# Altium footprint library SMT.PcbLib: 379 footprints (part 6 of 24)
Each footprint in its own frame and in the unit in brackets; x right, y up, seen from the top. Pads: shape width x height; smd on the part's side, far side on the other; paste and mask are expansions set on the pad; w line width, h text height; cw(c..) or ccw(c..) is an arc to the next point about the centre after c.
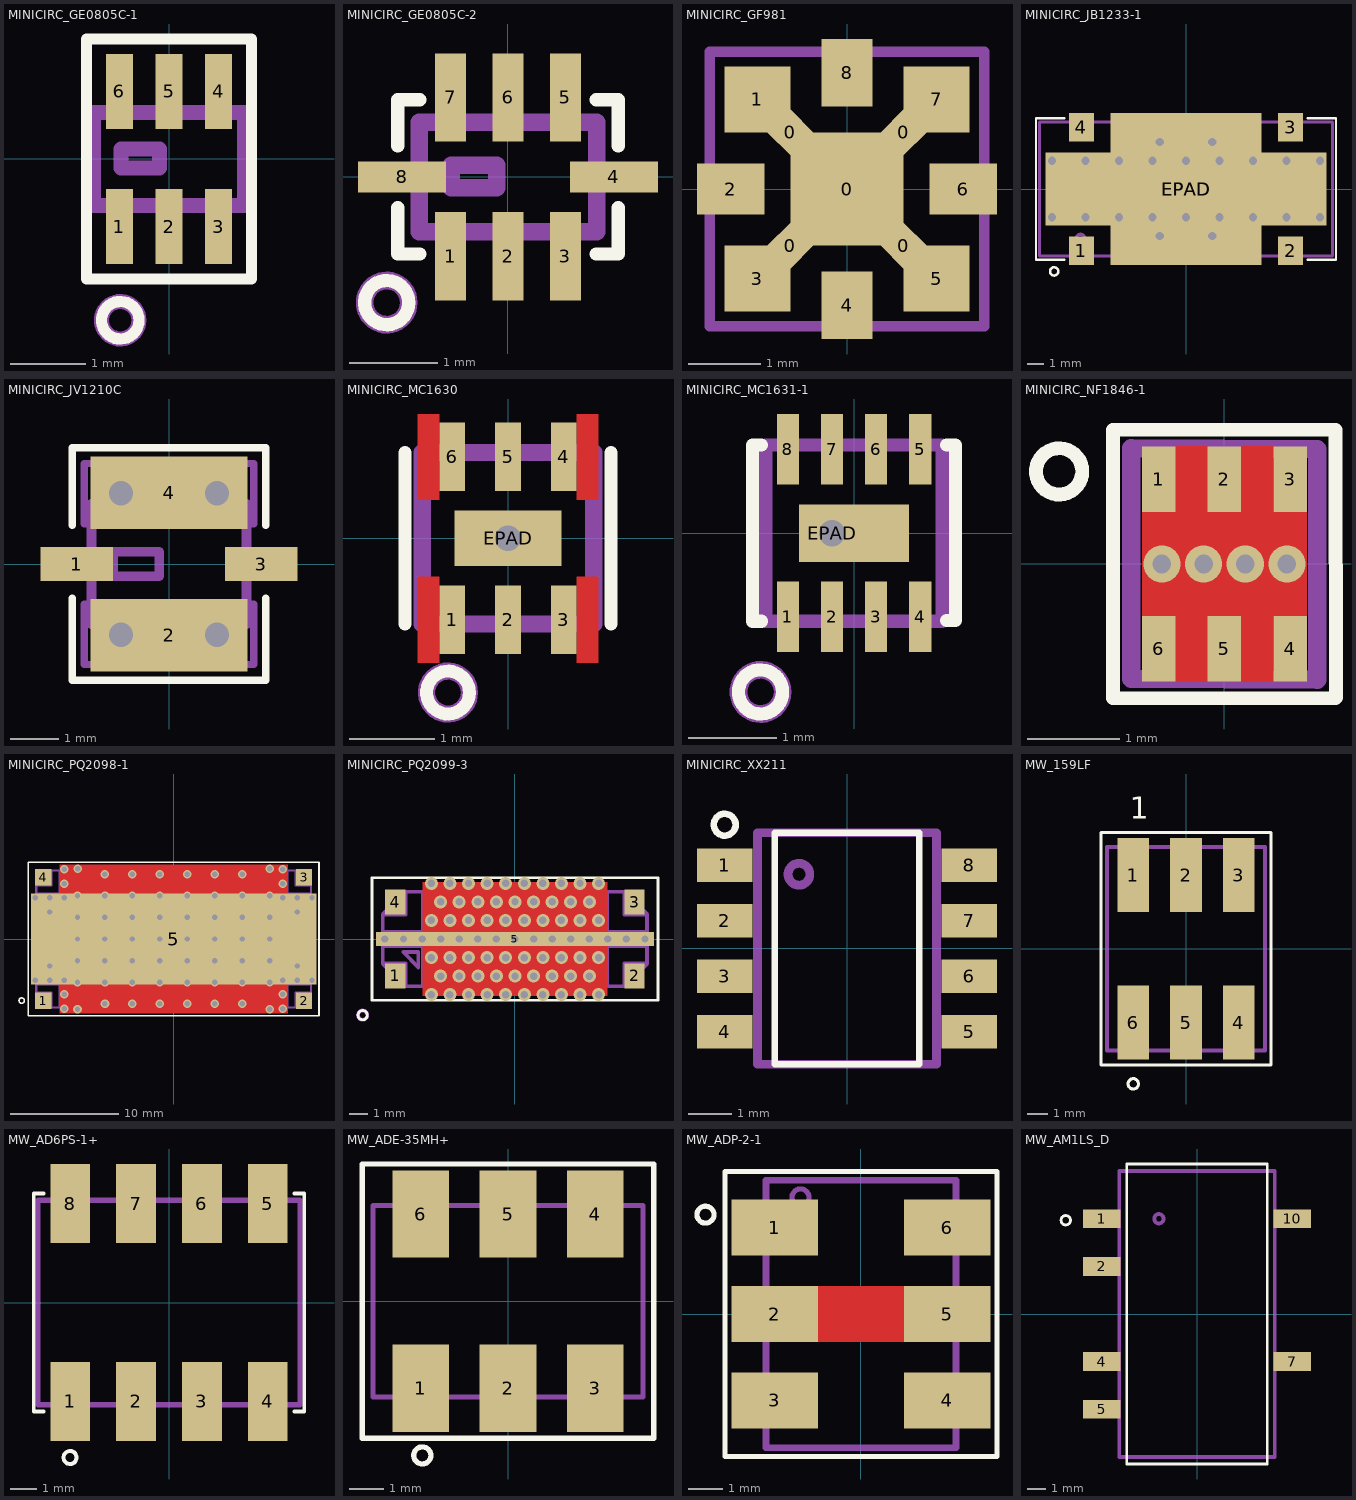
[diagram p5: the footprints below, top view; thin cyan lines are the x and y axes]

## MINICIRC_GE0805C-1 [mm] "6-Leads, Body 2.01x1.24mm, Pitch 0.65mm"
height 1.07
pads (6):
  rect 0.36x1 smd mask+0.05: 1(-0.66,-0.9) 2(0,-0.9) 3(0.66,-0.9) 4(0.66,0.9) 5(0,0.9) 6(-0.66,0.9)
Top Overlay:
  circle w0.15: c-0.65,-2.15 r0.25
  lines w0.15: -1.1,-1.6 1.1,-1.6 1.1,1.6 -1.1,1.6 -1.1,-1.6
Mechanical 1:
  circle w0.2: c-0.65,-2.15 r0.25
  lines w0.2: -1.005,-0.62 1.005,-0.62 1.005,0.62 -1.005,0.62 -1.005,-0.62 ; -0.643,-0.123 -0.643,0.131 -0.127,0.131 -0.127,-0.123 -0.643,-0.123
3D body "NCS2-392+.stp": height 0.87, standoff 0.03, extent -1.005,-0.62 1.005,0.62

## MINICIRC_GE0805C-2 [mm] "8-Leads, Body 2.0x1.25mm, Pitch 0.65mm"
height 0.95
pads (8):
  rect 0.35x1 smd mask+0.05: 1(-0.65,-0.9) 2(0,-0.9) 3(0.65,-0.9) 5(0.65,0.9) 6(0,0.9) 7(-0.65,0.9)
  rect 1x0.35 smd mask+0.05: 4(1.2,0) 8(-1.2,0)
Top Overlay:
  circle w0.15: c-1.375,-1.425 r0.25
  lines w0.15: -1.25,-0.35 -1.25,-0.875 -1,-0.875 ; -1.25,0.35 -1.25,0.875 -1,0.875 ; 1,-0.875 1.25,-0.875 1.25,-0.35 ; 1,0.875 1.25,0.875 1.25,0.35
Mechanical 1:
  circle w0.2: c-1.375,-1.425 r0.25
  lines w0.2: -1.005,-0.62 -1.005,0.62 1.005,0.62 1.005,-0.62 -1.005,-0.62 ; -0.643,-0.123 -0.127,-0.123 -0.127,0.131 -0.643,0.131 -0.643,-0.123
3D body "User Library-GE0805C-2.STEP": height 0.94, standoff -0.01, extent -1.015,-0.64 1.015,0.64

## MINICIRC_GF981 [mil]
height 31.89
pads (13):
  rect 18x30 smd rot 135: 0(-31,-31) 0(31,31)
  rect 18x30 smd rot 45: 0(-31,31) 0(31,-31)
  rect 62x62 smd: 0(0,0)
  rect 36x36 smd: 1(-49,49) 3(-49,-49) 5(49,-49) 7(49,49)
  rect 37x28 smd: 2(-63.5,0) 6(63.5,0)
  rect 28x37 smd: 4(0,-63.5) 8(0,63.5)
Mechanical 1:
  lines w5.91: -75,-75 -75,75 75,75 75,-75 -75,-75
Mechanical 20:
  text "Необходима прошивка, / см. PDF" at -285.05,-38.98 h70.87
3D body "GF981.stp": height 32.49, standoff 0.6, extent -75,-75 75,75

## MINICIRC_JB1233-1 [mil] "Bi-Directional Coupler"
height 200
pads (6):
  rect 60x67 smd: 1(-250,-147.5) 2(250,-147.5) 3(250,147.5) 4(-250,147.5)
  rect 670x175 smd paste-393.7 mask+4: EPAD(0,0)
  rect 360x362 smd paste-393.7: EPAD(0,0)
via 62.5,-112.5 diameter 31.5 hole 19.68
via -62.5,-112.5 diameter 31.5 hole 19.68
via -62.5,112.5 diameter 31.5 hole 19.68
via 62.5,112.5 diameter 31.5 hole 19.68
via 320,-67.5 diameter 31.5 hole 19.68
via 240,-67.5 diameter 31.5 hole 19.68
via 160,-67.5 diameter 31.5 hole 19.68
via 80,-67.5 diameter 31.5 hole 19.68
via 0,-67.5 diameter 31.5 hole 19.68
via 320,67.5 diameter 31.5 hole 19.68
via 240,67.5 diameter 31.5 hole 19.68
via 160,67.5 diameter 31.5 hole 19.68
via 80,67.5 diameter 31.5 hole 19.68
via 0,67.5 diameter 31.5 hole 19.68
via -80,-67.5 diameter 31.5 hole 19.68
via -160,-67.5 diameter 31.5 hole 19.68
via -240,-67.5 diameter 31.5 hole 19.68
via -320,-67.5 diameter 31.5 hole 19.68
via -80,67.5 diameter 31.5 hole 19.68
via -160,67.5 diameter 31.5 hole 19.68
via -240,67.5 diameter 31.5 hole 19.68
via -320,67.5 diameter 31.5 hole 19.68
Top Overlay:
  circle w5.91: c-314.96,-196.85 r9.84
  lines w5.91: -291.34,-169.29 -358.27,-169.29 -358.27,169.29 -291.34,169.29 ; 291.34,-169.29 358.27,-169.29 358.27,169.29 291.34,169.29
Top Paste:
  rectangle: -322.83,-31.5 322.83,31.5
  rectangle: -29.53,114.17 29.53,178.15
  rectangle: -154.72,114.17 -95.67,178.15
  region: 154.72,178.15 95.67,178.15 95.67,114.17 154.72,114.17
  region: 154.72,-114.17 95.67,-114.17 95.67,-178.15 154.72,-178.15
  rectangle: -154.72,-178.15 -95.67,-114.17
  rectangle: -29.53,-178.15 29.53,-114.17
Top Solder:
  rectangle: -335.63,-47.5 335.63,47.5
  rectangle: -180,87.5 180,181
  rectangle: -180,-181 180,-87.5
Mechanical 1:
  circle w7.87: c-251.97,-118.11 r9.84
  lines w7.87: -350,-160.04 -350,160.04 -261.42,160.04 ccw(c-250.39,160.04) -239.37,160.04 -136.22,160.04 ccw(c-125.2,160.04) -114.17,160.04 -11.02,160.04 ccw(c0,160.04) 11.02,160.04 114.17,160.04 ccw(c125.2,160.04) 136.22,160.04 239.37,160.04 ccw(c250.39,160.04) 261.42,160.04 350,160.04 350,-160.04 261.42,-160.04 ccw(c250.39,-160.04) 239.37,-160.04 136.22,-160.04 ccw(c125.2,-160.04) 114.17,-160.04 11.02,-160.04 ccw(c0,-160.04) -11.02,-160.04 -114.17,-160.04 ccw(c-125.2,-160.04) -136.22,-160.04 -239.37,-160.04 ccw(c-250.39,-160.04) -261.42,-160.04 -350,-160.04
Mechanical 20:
  text "Требуется прошивка, см. PDF" at -352.5,262 h60
3D body "JB1233-1.stp": height 140.16, standoff 0, extent -349.99,-160.03 350.01,160.04

## MINICIRC_JV1210C [mil] "Small size 3.2mm x 2.5 mm High Pass Filter"
height 62.99
pads (4):
  rect 59x28 smd mask+1.97: 1(-75,0) 3(75,0)
  rect 128x59 smd mask+1.97: 2(0,-58) 4(0,58)
via -39,57.5 diameter 39.37 hole 19.68
via 39,57.5 diameter 39.37 hole 19.68
via 39,-57.5 diameter 39.37 hole 19.68
via -39,-57.5 diameter 39.37 hole 19.68
Top Overlay:
  lines w5.91: -78.74,-27.56 -78.74,-94.49 78.74,-94.49 78.74,-27.56 ; -78.74,31.5 -78.74,94.49 78.74,94.49 78.74,31.5
Mechanical 1:
  lines w7.87: -62.99,-49.02 62.99,-49.02 62.99,49.02 -62.99,49.02 -62.99,-49.02 ; -45.57,-9.95 -45.57,9.95 -7.87,9.95 -7.87,-9.95 -45.57,-9.95
Mechanical 5:
  lines w5.91: -68.9,-81.76 -68.9,-32.55 68.9,-32.55 68.9,-81.76 -68.9,-81.76 ; -68.9,32.55 68.9,32.55 68.9,81.76 -68.9,81.76 -68.9,32.55
Mechanical 20:
  text "Отв.0,5  / must be plugged" at -187.01,-39.37 h39.37
3D body "JV1210C.stp": height 63.39, standoff 0, extent -62.99,-49.01 63,49.02

## MINICIRC_MC1630 [mm] "SMD, Body:2.00x2.00x0.85mm, Thermal Pad:1.25x0.65, 6-Leads, Pitch 0.65mm"
height 0.85
pads (7):
  rect 0.3x0.8 smd paste+0 mask+0.05: 1(-0.65,-0.95) 2(0,-0.95) 3(0.65,-0.95) 4(0.65,0.95) 5(0,0.95) 6(-0.65,0.95)
  rect 1.25x0.65 hole 0.3 mask+0.05: EPAD(0,0)
Top Layer:
  pour cut-out: 0.8,0.45 0.8,1.45 1.05,1.45 1.05,0.45
  pour cut-out: -0.8,-0.45 -0.8,-1.45 -1.05,-1.45 -1.05,-0.45
  pour cut-out: 0.8,-1.45 0.8,-0.45 1.05,-0.45 1.05,-1.45
  pour cut-out: -0.8,1.45 -0.8,0.45 -1.05,0.45 -1.05,1.45
Top Overlay:
  circle w0.15: c-0.7,-1.8 r0.25
  lines w0.15: -1.2,-1 -1.2,1 ; 1.2,-1 1.2,1
Top Paste:
  region: 0.6,-0.3 -0.6,-0.3 -0.6,0.3 0.6,0.3
Mechanical 1:
  circle w0.2: c-0.7,-1.8 r0.25
  lines w0.2: -1,-1 1,-1 1,1 -1,1 -1,-1
Mechanical 20:
  text "Есть рекомендации по" at -3.9,3.3 h1
  text "прошивке, зоны запрета, см. Pdf" at -5.5,2.4 h1
3D body "Микросхема YAT-2+ (MC1630) Mini-Circuits.stp": height 0.85, standoff 0, extent -1.001,-1.01 0.999,1.01

## MINICIRC_MC1631-1 [mm] "SMD, Body:2.00x2.00x1.05mm, Thermal Pad:1.25x0.65, 8-Leads, Pitch 0.5mm"
height 1.05
pads (9):
  rect 0.25x0.8 smd mask+0.05: 1(-0.75,-0.95) 2(-0.25,-0.95) 3(0.25,-0.95) 4(0.75,-0.95) 5(0.75,0.95) 6(0.25,0.95) 7(-0.25,0.95) 8(-0.75,0.95)
  rect 1.25x0.65 hole 0.3 copper offset 0.25,0 mask+0.05: EPAD(-0.25,0)
Top Overlay:
  circle w0.15: c-1.06,-1.8 r0.25
  lines w0.15: -1.05,-1 -1.15,-1 -1.15,1 -1.05,1 ; 1.05,-0.99 1.15,-0.99 1.15,1 1.05,1
Top Paste:
  region: -0.625,0.325 0.625,0.325 0.625,-0.325 -0.625,-0.325
Mechanical 1:
  circle w0.2: c-1.06,-1.8 r0.25
  lines w0.15: -1,-1 -1,1 1,1 1,-1 -1,-1
Mechanical 20:
  text "прошивке, см. Pdf" at -3.3,1.86 h1
  text "Есть рекомендации по" at -4.1,2.66 h1
3D body "Микросхема EQY-4-63+ (MC1631-1).stp": height 1.05, standoff 0, extent -1,-1.01 1,1.01

## MINICIRC_NF1846-1 [mm] "6-Leads, Body 2.01x2.49mm, Pitch 0.71mm"
height 0.89
pads (6):
  rect 0.36x0.71 smd mask+0.05: 1(-0.71,0.915) 2(0,0.915) 3(0.71,0.915) 4(0.71,-0.915) 5(0,-0.915) 6(-0.71,-0.915)
via 0.225,0 diameter 0.4 hole 0.2
via -0.225,0 diameter 0.4 hole 0.2
via 0.675,0 diameter 0.4 hole 0.2
via -0.675,0 diameter 0.4 hole 0.2
Top Layer:
  region: -0.18,-0.56 -0.18,-0.205 -0.89,-0.205 -0.89,0.56 -0.53,0.56 -0.53,0.205 0.53,0.205 0.53,0.56 0.89,0.56 0.89,-0.205 0.18,-0.205 0.18,-0.56
  pour cut-out: 0.18,-0.205 0.89,-0.205 0.89,-0.56 0.53,-0.56 0.53,-1.27 0.18,-1.27
  pour cut-out: -0.89,-0.205 -0.18,-0.205 -0.18,-1.27 -0.53,-1.27 -0.53,-0.56 -0.89,-0.56
  pour cut-out: -0.53,1.27 -0.53,0.205 0.53,0.205 0.53,1.27 0.18,1.27 0.18,0.56 -0.18,0.56 -0.18,1.27
Top Overlay:
  circle w0.15: c-1.785,1 r0.25
  lines w0.15: -1.205,-1.45 -1.205,1.45 1.2,1.45 ; -1.2,-1.45 1.2,-1.45 ; 1.2,1.44 1.205,-1.44
Top Solder:
  region: -0.23,-0.51 -0.23,-0.25 -0.94,-0.25 -0.94,0.52 -0.48,0.52 -0.48,0.25 0.48,0.25 0.48,0.52 0.94,0.52 0.94,-0.25 0.23,-0.25 0.23,-0.51
Mechanical 1:
  circle w0.2: c-0.495,0.72 r0.25
  lines w0.2: -1.005,-1.241 1.005,-1.249 1.005,1.241 -1.005,1.249 -1.005,-1.241
Mechanical 20:
  text "Прошивка  / по datasheet" at -2.37,-1.005 h1.2
3D body "NCR2-123+.stp": height 0.89, standoff -0.01, extent -1.005,-1.245 1.005,1.245

## MINICIRC_PQ2098-1 [mm] "Power Splitter/Combiner"
height 5.08
pads (5):
  rect 1.52x1.52 smd: 1(-12.065,-5.715) 2(12.065,-5.715) 3(12.065,5.715) 4(-12.065,5.715)
  rect 26.41x8.39 smd paste-10: 5(0,0)
via -11.45,2.5 diameter 0.8 hole 0.5
via -11.45,-2.5 diameter 0.8 hole 0.5
via 11.45,-2.5 diameter 0.8 hole 0.5
via 11.45,2.5 diameter 0.8 hole 0.5
via -8.89,0 diameter 0.8 hole 0.5
via -6.35,0 diameter 0.8 hole 0.5
via -3.81,0 diameter 0.8 hole 0.5
via -1.27,0 diameter 0.8 hole 0.5
via 8.89,0 diameter 0.8 hole 0.5
via 6.35,0 diameter 0.8 hole 0.5
via -10.1,6.45 diameter 0.8 hole 0.5
via -10.1,3.8 diameter 0.8 hole 0.5
via -12.8,3.8 diameter 0.8 hole 0.5
via -11.45,3.8 diameter 0.8 hole 0.5
via -10.1,5.1 diameter 0.8 hole 0.5
via -10.1,-5.1 diameter 0.8 hole 0.5
via -11.45,-3.8 diameter 0.8 hole 0.5
via -12.8,-3.8 diameter 0.8 hole 0.5
via -10.1,-3.8 diameter 0.8 hole 0.5
via -10.1,-6.45 diameter 0.8 hole 0.5
via 10.1,-5.1 diameter 0.8 hole 0.5
via 11.45,-3.8 diameter 0.8 hole 0.5
via 12.8,-3.8 diameter 0.8 hole 0.5
via 10.1,-3.8 diameter 0.8 hole 0.5
via 10.1,-6.45 diameter 0.8 hole 0.5
via 10.1,5.1 diameter 0.8 hole 0.5
via 11.45,3.8 diameter 0.8 hole 0.5
via 12.8,3.8 diameter 0.8 hole 0.5
via 10.1,3.8 diameter 0.8 hole 0.5
via 10.1,6.45 diameter 0.8 hole 0.5
via 1.27,0 diameter 0.8 hole 0.5
via 3.81,0 diameter 0.8 hole 0.5
via -8.89,2 diameter 0.8 hole 0.5
via -8.89,-2 diameter 0.8 hole 0.5
via -8.89,-4 diameter 0.8 hole 0.5
via -8.89,4 diameter 0.8 hole 0.5
via 3.81,2 diameter 0.8 hole 0.5
via 1.27,2 diameter 0.8 hole 0.5
via 6.35,2 diameter 0.8 hole 0.5
via 8.89,2 diameter 0.8 hole 0.5
via -1.27,2 diameter 0.8 hole 0.5
via -3.81,2 diameter 0.8 hole 0.5
via -6.35,2 diameter 0.8 hole 0.5
via 3.81,4 diameter 0.8 hole 0.5
via 1.27,4 diameter 0.8 hole 0.5
via 6.35,4 diameter 0.8 hole 0.5
via 8.89,4 diameter 0.8 hole 0.5
via -1.27,4 diameter 0.8 hole 0.5
via -3.81,4 diameter 0.8 hole 0.5
via -6.35,4 diameter 0.8 hole 0.5
via 3.81,-2 diameter 0.8 hole 0.5
via 1.27,-2 diameter 0.8 hole 0.5
via 6.35,-2 diameter 0.8 hole 0.5
via 8.89,-2 diameter 0.8 hole 0.5
via -1.27,-2 diameter 0.8 hole 0.5
via -3.81,-2 diameter 0.8 hole 0.5
via -6.35,-2 diameter 0.8 hole 0.5
via 3.81,-4 diameter 0.8 hole 0.5
via 1.27,-4 diameter 0.8 hole 0.5
via 6.35,-4 diameter 0.8 hole 0.5
via 8.89,-4 diameter 0.8 hole 0.5
via -1.27,-4 diameter 0.8 hole 0.5
via -3.81,-4 diameter 0.8 hole 0.5
via -6.35,-4 diameter 0.8 hole 0.5
via -8.88,6.5 diameter 0.8 hole 0.5
via -6.35,-6 diameter 0.8 hole 0.5
via -3.81,-6 diameter 0.8 hole 0.5
via -1.27,-6 diameter 0.8 hole 0.5
via 8.89,-6.5 diameter 0.8 hole 0.5
via 6.35,-6 diameter 0.8 hole 0.5
via 1.27,-6 diameter 0.8 hole 0.5
via 3.81,-6 diameter 0.8 hole 0.5
via -8.89,-6.5 diameter 0.8 hole 0.5
via -6.36,6 diameter 0.8 hole 0.5
via -3.82,6 diameter 0.8 hole 0.5
via -1.28,6 diameter 0.8 hole 0.5
via 8.9,6.5 diameter 0.8 hole 0.5
via 6.34,6 diameter 0.8 hole 0.5
via 1.26,6 diameter 0.8 hole 0.5
via 3.8,6 diameter 0.8 hole 0.5
Top Layer:
  region: -10.545,6.855 10.545,6.855 10.545,-6.855 -10.545,-6.855
Top Overlay:
  circle w0.15: c-14.05,-5.7 r0.25
  lines w0.15: -13.45,-7.1 -13.45,7.1 13.45,7.1 13.45,-7.1 -13.45,-7.1
Top Solder:
  region: -10.64,6.955 10.64,6.955 10.64,-6.955 -10.64,-6.955
Mechanical 1:
  circle w0.2: c-9.5,-5.4 r0.25
  lines w0.2: -12.7,-4.95 -11.3,-4.95 -11.3,-6.35 ; -12.7,-4.95 -12.7,-5.5 -11.85,-6.35 -11.3,-6.35 ; -12.7,-4.95 -12.7,-4.19 ; -12.7,-4.19 -10.54,-4.19 -10.54,-6.35 ; -12.7,-4.19 -12.7,-2.54 -12.37,-2.21 -12.37,2.21 -12.7,2.54 -12.7,4.19 ; -12.7,4.19 -10.54,4.19 -10.54,6.35 ; -12.7,4.19 -12.7,4.95 ; -12.7,4.95 -11.3,4.95 -11.3,6.35 ; -12.7,4.95 -12.7,5.5 -11.85,6.35 -11.3,6.35 ; -11.3,-6.35 -10.54,-6.35 ; -11.3,6.35 -10.54,6.35 ; -10.54,-6.35 -8.89,-6.35 -8.56,-6.02 8.56,-6.02 8.89,-6.35 10.54,-6.35 ; -10.54,6.35 -8.89,6.35 -8.56,6.02 8.56,6.02 8.89,6.35 10.54,6.35 ; 10.54,-6.35 10.54,-4.19 12.7,-4.19 ; 10.54,-6.35 11.3,-6.35 ; 10.54,6.35 10.54,4.19 12.7,4.19 ; 10.54,6.35 11.3,6.35 ; 11.3,-6.35 11.3,-4.95 12.7,-4.95 ; 11.3,-6.35 11.85,-6.35 12.7,-5.5 12.7,-4.95 ; 11.3,6.35 11.85,6.35 12.7,5.5 12.7,4.95 ; 11.3,6.35 11.3,4.95 12.7,4.95 ; 12.7,-4.95 12.7,-4.19 ; 12.7,-4.19 12.7,-2.54 12.37,-2.21 12.37,2.21 12.7,2.54 12.7,4.19 ; 12.7,4.19 12.7,4.95
  text "MCL" at -11.132,1.528 h3
Mechanical 20:
  text "Прошивка для материала Rogers RO4003C 0.813, / при другом материале - согласовать с разработчиком, / см. PDF" at -16.55,-2.3 h1.52
3D body "Case PQ2098-1.stp": height 5.08, standoff 0, extent -12.7,-6.35 12.7,6.35

## MINICIRC_PQ2099-3 [mm] "Power Splitter/Combiner"
height 1.6
pads (5):
  rect 1.09x1.35 smd: 1(-6.44,-1.99) 2(6.44,-1.99) 3(6.44,1.99) 4(-6.44,1.99)
  rect 14.97x0.75 smd paste-5: 5(0,0)
via 4.5,3 diameter 0.7 hole 0.4
via 3.5,3 diameter 0.7 hole 0.4
via 2.5,3 diameter 0.7 hole 0.4
via 1.5,3 diameter 0.7 hole 0.4
via -4.5,3 diameter 0.7 hole 0.4
via -3.5,3 diameter 0.7 hole 0.4
via -2.5,3 diameter 0.7 hole 0.4
via -1.5,3 diameter 0.7 hole 0.4
via -0.5,3 diameter 0.7 hole 0.4
via 0.5,3 diameter 0.7 hole 0.4
via 4.5,-3 diameter 0.7 hole 0.4
via 3.5,-3 diameter 0.7 hole 0.4
via 2.5,-3 diameter 0.7 hole 0.4
via 1.5,-3 diameter 0.7 hole 0.4
via -4.5,-3 diameter 0.7 hole 0.4
via -3.5,-3 diameter 0.7 hole 0.4
via -2.5,-3 diameter 0.7 hole 0.4
via -1.5,-3 diameter 0.7 hole 0.4
via -0.5,-3 diameter 0.7 hole 0.4
via 0.5,-3 diameter 0.7 hole 0.4
via 4,2 diameter 0.7 hole 0.4
via 3,2 diameter 0.7 hole 0.4
via 2,2 diameter 0.7 hole 0.4
via -4,2 diameter 0.7 hole 0.4
via -3,2 diameter 0.7 hole 0.4
via -2,2 diameter 0.7 hole 0.4
via -1,2 diameter 0.7 hole 0.4
via 0,2 diameter 0.7 hole 0.4
via 1,2 diameter 0.7 hole 0.4
via 4.5,1 diameter 0.7 hole 0.4
via 3.5,1 diameter 0.7 hole 0.4
via 2.5,1 diameter 0.7 hole 0.4
via 1.5,1 diameter 0.7 hole 0.4
via -4.5,1 diameter 0.7 hole 0.4
via -3.5,1 diameter 0.7 hole 0.4
via -2.5,1 diameter 0.7 hole 0.4
via -1.5,1 diameter 0.7 hole 0.4
via -0.5,1 diameter 0.7 hole 0.4
via 0.5,1 diameter 0.7 hole 0.4
via 4,-2 diameter 0.7 hole 0.4
via 3,-2 diameter 0.7 hole 0.4
via 2,-2 diameter 0.7 hole 0.4
via -4,-2 diameter 0.7 hole 0.4
via -3,-2 diameter 0.7 hole 0.4
via -2,-2 diameter 0.7 hole 0.4
via -1,-2 diameter 0.7 hole 0.4
via 0,-2 diameter 0.7 hole 0.4
via 1,-2 diameter 0.7 hole 0.4
via 4.5,-1 diameter 0.7 hole 0.4
via 3.5,-1 diameter 0.7 hole 0.4
via 2.5,-1 diameter 0.7 hole 0.4
via 1.5,-1 diameter 0.7 hole 0.4
via -4.5,-1 diameter 0.7 hole 0.4
via -3.5,-1 diameter 0.7 hole 0.4
via -2.5,-1 diameter 0.7 hole 0.4
via -1.5,-1 diameter 0.7 hole 0.4
via -0.5,-1 diameter 0.7 hole 0.4
via 0.5,-1 diameter 0.7 hole 0.4
via 6,0 diameter 0.7 hole 0.4
via 5,0 diameter 0.7 hole 0.4
via 4,0 diameter 0.7 hole 0.4
via 3,0 diameter 0.7 hole 0.4
via 2,0 diameter 0.7 hole 0.4
via -7,0 diameter 0.7 hole 0.4
via 7,0 diameter 0.7 hole 0.4
via -6,0 diameter 0.7 hole 0.4
via -5,0 diameter 0.7 hole 0.4
via -4,0 diameter 0.7 hole 0.4
via -3,0 diameter 0.7 hole 0.4
via -2,0 diameter 0.7 hole 0.4
via -1,0 diameter 0.7 hole 0.4
via 0,0 diameter 0.7 hole 0.4
via 1,0 diameter 0.7 hole 0.4
Top Layer:
  region: -4.955,-3.045 -4.955,3.045 4.955,3.045 4.955,-3.045
Top Overlay:
  circle w0.15: c-8.2,-4.1 r0.25
  lines w0.15: -7.7,-3.3 7.7,-3.3 7.7,3.3 -7.7,3.3 -7.7,-3.3
Top Paste:
  region: 6,0.35 6,-0.35 7.5,-0.35 7.5,0.35
  region: -6,0.35 -6,-0.35 -7.5,-0.35 -7.5,0.35
Top Solder:
  region: -5.055,-3.145 -5.055,3.145 5.055,3.145 5.055,-3.145
Mechanical 1:
  circle w0.2: c-8.2,-4.1 r0.25
  lines w0.2: -7.11,-1.315 -5.895,-1.315 -5.895,-2.54 ; -7.11,1.315 -5.895,1.315 -5.895,2.54 ; -4.955,-2.54 -4.955,-0.375 -7.11,-0.375 ; -4.955,2.54 -4.955,0.375 -7.11,0.375 ; 4.955,-2.54 4.955,-0.375 7.11,-0.375 ; 4.955,2.54 4.955,0.375 7.11,0.375 ; 5.895,-2.54 5.895,-1.315 7.11,-1.315 ; 5.895,2.54 5.895,1.315 7.11,1.315 ; -7.11,-0.375 ccw(c-7.11,0) -7.11,0.375 ; -7.11,-0.375 -7.11,-1.34 -5.91,-2.54 -4.19,-2.54 -3.86,-2.21 3.86,-2.21 4.19,-2.54 5.91,-2.54 7.11,-1.34 7.11,-0.375 ; -7.11,0.375 -7.11,1.34 -5.91,2.54 -4.19,2.54 -3.86,2.21 3.86,2.21 4.19,2.54 5.91,2.54 7.11,1.34 7.11,0.375 ; 7.11,-0.375 cw(c7.11,0) 7.11,0.375 ; -6,-0.7 -5.2,-1.552 -5.2,-0.7 -6,-0.7
Mechanical 20:
  text "Прошивка для материала / TACONIC RF-35TC 1oz, при / другом материале - согласовать / с разработчиком,см. PDF. / Указания о вырезах в земляном / полигоне под сигнальными / пинами см. PDF. Паять по торцам." at -9,-3.8 h1.3
3D body "PQ2099-3.stp": height 1.61, standoff 0, extent -7.11,-2.54 7.11,2.54

## MINICIRC_XX211 [mm] "SOP, 8-Leads, Body 5,33x4,14mm, Pitch 1,27mm, IPC Medium Density"
height 1.96
pads (8):
  rect 1.27x0.76 smd: 1(-2.8,1.905) 2(-2.8,0.635) 3(-2.8,-0.635) 4(-2.8,-1.905) 5(2.8,-1.905) 6(2.8,-0.635) 7(2.8,0.635) 8(2.8,1.905)
Top Overlay:
  circle w0.15: c-2.8,2.835 r0.25
  lines w0.15: -1.65,-2.65 1.65,-2.65 1.65,2.65 -1.65,2.65 -1.65,-2.65
Mechanical 1:
  circle w0.2: c-1.1,1.7 r0.25
  lines w0.2: -2.05,-2.65 2.05,-2.65 2.05,2.65 -2.05,2.65 -2.05,-2.65
3D body "SOP127P600X196-8N.step": height 1.96, standoff 0, extent -2.985,-2.65 2.985,2.65

## MW_159LF [mm]
height 5.08
pads (6):
  rect 1.53x3.56 smd: 1(-2.54,3.55) 2(0,3.55) 3(2.54,3.55) 4(2.54,-3.55) 5(0,-3.55) 6(-2.54,-3.55)
Top Overlay:
  circle w0.15: c-2.54,-6.5 r0.25
  lines w0.15: -4.1,-5.6 -4.1,5.6 4.1,5.6 4.1,-5.6 -4.1,-5.6
  text "1" at -2.7,5.9 h1.8
Mechanical 1:
  circle w0.2: c-2.54,-4.1 r0.25
  lines w0.2: -3.81,-4.9 -3.81,4.9 3.81,4.9 3.81,-4.9 -3.81,-4.9
3D body "159LF.stp": height 5.09, standoff 0.01, extent -3.8,-4.9 3.82,4.9

## MW_AD6PS-1+ [mil] "Small surface mount package 10X7.9"
height 214.96
pads (8):
  rect 60x120 smd: 1(-150,-150) 2(-50,-150) 3(50,-150) 4(150,-150) 5(150,150) 6(50,150) 7(-50,150) 8(-150,150)
Top Overlay:
  circle w5.91: c-150,-235 r9.84
  lines w5.91: -190,-165 -205,-165 -205,165 -190,165 ; 190,-165 205,-165 205,165 190,165
Mechanical 1:
  circle w7.87: c-150,-120 r9.84
  lines w7.87: -198.42,-155 -198.42,155 198.43,155 198.43,-155 -198.42,-155
3D body "User Library-CJ725.STEP": height 218.99, standoff 0.48, extent -206.7,-198.42 206.69,198.43

## MW_ADE-35MH+ [mil] "SMT_7.87X5.59X2.84"
height 112
pads (6):
  rect 65x100 smd: 1(-100,-100) 2(0,-100) 3(100,-100) 4(100,100) 5(0,100) 6(-100,100)
Top Overlay:
  circle w5.91: c-98.43,-177.17 r9.84
  lines w5.91: -167.32,-157.48 167.32,-157.48 167.32,157.48 -157.48,157.48 -167.32,157.48 -167.32,-157.48
Mechanical 1:
  circle w7.87: c-108.27,-78.74 r9.84
  lines w5.91: -155,-110 -155,110 155,110 155,-110 -155,-110
3D body "ADE-35MH+.stp": height 111.81, standoff 0, extent -154.92,-136.02 154.93,136.03

## MW_ADP-2-1 [mm] "CFP, 6-Leads, Body 7,87x5,59mm (max), Pitch 2,54mm, IPC Medium Density"
height 4.11
pads (6):
  rect 2.54x1.65 smd: 1(-2.54,2.54) 2(-2.54,0) 3(-2.54,-2.54) 4(2.54,-2.54) 5(2.54,0) 6(2.54,2.54)
Top Layer:
  lines w1.65: -2.54,0 2.54,0
Top Overlay:
  circle w0.15: c-4.572,2.921 r0.25
  lines w0.15: -4,-4.191 4,-4.191 4,4.191 -4,4.191 -4,-4.191
Mechanical 1:
  circle w0.15: c-1.778,3.429 r0.25
  lines w0.2: -2.795,-3.935 2.795,-3.935 2.795,3.935 -2.795,3.935 -2.795,-3.935
3D body "User Library-CD636.STEP": height 4.12, standoff 0, extent -3.455,-3.935 3.455,3.935

## MW_AM1LS_D [mm] "SMD, 6-Leads, Body 15,25x8,31mm, Pitch 2,54mm, IPC Medium Density"
height 7.6
pads (6):
  rect 2x1 smd: 1(-5.075,5.08) 2(-5.075,2.54) 4(-5.075,-2.54) 5(-5.075,-5.08) 7(5.075,-2.54) 10(5.075,5.08)
Top Overlay:
  circle w0.15: c-7,5 r0.25
  lines w0.15: -3.75,-8 -3.75,8 3.75,8 3.75,-8 -3.75,-8
Mechanical 1:
  circle w0.2: c-2.032,5.08 r0.25
  lines w0.15: -5.6,-5.08 -4.15,-5.08 ; -5.588,-2.54 -4.15,-2.54 ; -5.588,2.54 -4.15,2.54 ; -5.588,5.08 -4.15,5.08 ; 4.15,-2.54 5.588,-2.54 ; 4.15,5.08 5.588,5.08
  lines w0.2: -4.15,-7.62 -4.15,7.62 4.15,7.62 4.15,-7.62 -4.15,-7.62
3D body "AM1LS-NZ.stp": height 7.26, standoff 0.01, extent -5.6,-7.62 5.6,7.62